# Altium footprint library IC_SMD_DUAL.PCBLIB: 163 footprints (part 11 of 11)
Each footprint in its own frame and in the unit in brackets; x right, y up, seen from the top. Pads: shape width x height; smd on the part's side, far side on the other; paste and mask are expansions set on the pad; w line width, h text height; cw(c..) or ccw(c..) is an arc to the next point about the centre after c.
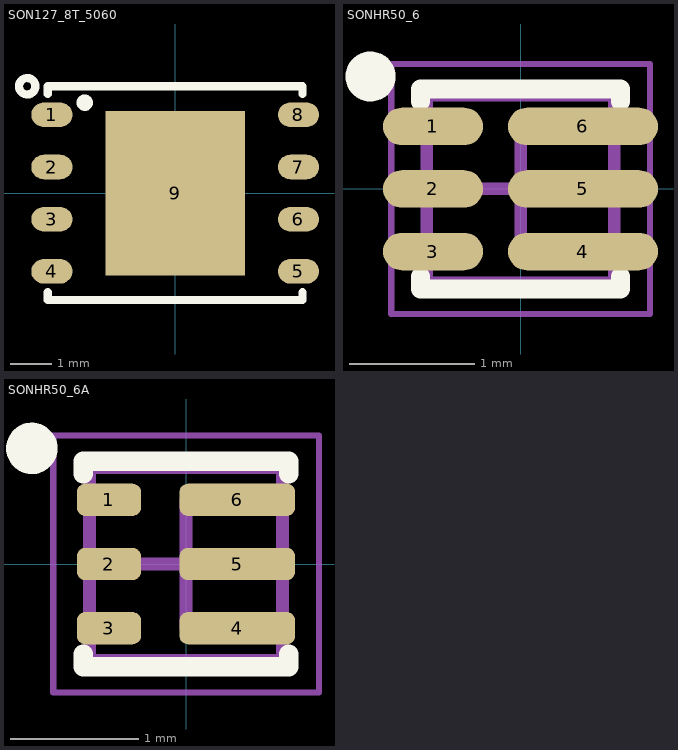
[diagram p10: the footprints below, top view; thin cyan lines are the x and y axes]

## SON127_8T_5060 [mm] "WSON8_6X5"
pads (9):
  oval 1x0.6 smd: 1(-3,1.905) 2(-3,0.635) 3(-3,-0.635) 4(-3,-1.905) 5(3,-1.905) 6(3,-0.635) 7(3,0.635) 8(3,1.905)
  rect 3.4x4 smd: 9(0,0)
TopOverlay:
  circle w0.2: c-2.2,2.2 r0.1
  circle w0.2: c-3.6,2.6 r0.2
  lines w0.2: -3.1,-2.413 -3.1,-2.6 3.1,-2.6 3.1,-2.413 ; -3.1,2.413 -3.1,2.6 3.1,2.6 3.1,2.413
3D body "SON127P600-8N.step": height 1, standoff 0, extent -3.05,-2.5 3.05,2.5

## SONHR50_6 [mm] "VSON-HR, 6, DMQ, 0.5mm pitch, 1.5x1.5mm"
height 1
pads (6):
  oval 0.8x0.3 smd mask+0.075: 1(-0.7,0.5) 2(-0.7,0) 3(-0.7,-0.5)
  oval 1.2x0.3 smd mask+0.075: 4(0.5,-0.5) 5(0.5,0) 6(0.5,0.5)
TopOverlay:
  circle w0.2: c-1.2,0.9 r0.1
  lines w0.15: -0.8,-0.7 -0.8,-0.8 0.8,-0.8 0.8,-0.7 ; -0.8,0.7 -0.8,0.8 0.8,0.8 0.8,0.7
Mechanical13:
  lines w0.1: -0.75,-0.75 0.75,-0.75 0.75,0.75 -0.75,0.75 -0.75,-0.75
Mechanical15:
  lines w0.05: -1.035,-1 1.035,-1 1.035,1 -1.035,1 -1.035,-1
  lines w0.1: -0.5,0 0.5,0 ; 0,-0.5 0,0.5
3D body "SONHR50_6.step": height 1, standoff 0, extent -0.751,-0.75 0.751,0.75

## SONHR50_6A [mm] "VSON-HR, 6, DMQ, 0.5mm pitch, 1.5x1.5mm"
height 1
pads (6):
  rrect50% 0.5x0.25 smd mask+0.075: 1(-0.6,0.5) 2(-0.6,0) 3(-0.6,-0.5)
  rrect50% 0.9x0.25 smd mask+0.075: 4(0.4,-0.5) 5(0.4,0) 6(0.4,0.5)
TopOverlay:
  circle w0.2: c-1.2,0.9 r0.1
  lines w0.15: -0.8,-0.7 -0.8,-0.8 0.8,-0.8 0.8,-0.7 ; -0.8,0.7 -0.8,0.8 0.8,0.8 0.8,0.7
Mechanical13:
  lines w0.1: -0.75,-0.75 0.75,-0.75 0.75,0.75 -0.75,0.75 -0.75,-0.75
Mechanical15:
  lines w0.05: -1.035,-1 1.035,-1 1.035,1 -1.035,1 -1.035,-1
  lines w0.1: -0.5,0 0.5,0 ; 0,-0.5 0,0.5
3D body "SONHR50_6.step": height 1, standoff 0, extent -0.751,-0.75 0.751,0.75